# Altium footprint library JDR2812（公开）.PcbLib: 142 footprints (part 6 of 9)
Each footprint in its own frame and in the unit in brackets; x right, y up, seen from the top. Pads: shape width x height; smd on the part's side, far side on the other; paste and mask are expansions set on the pad; w line width, h text height; cw(c..) or ccw(c..) is an arc to the next point about the centre after c.
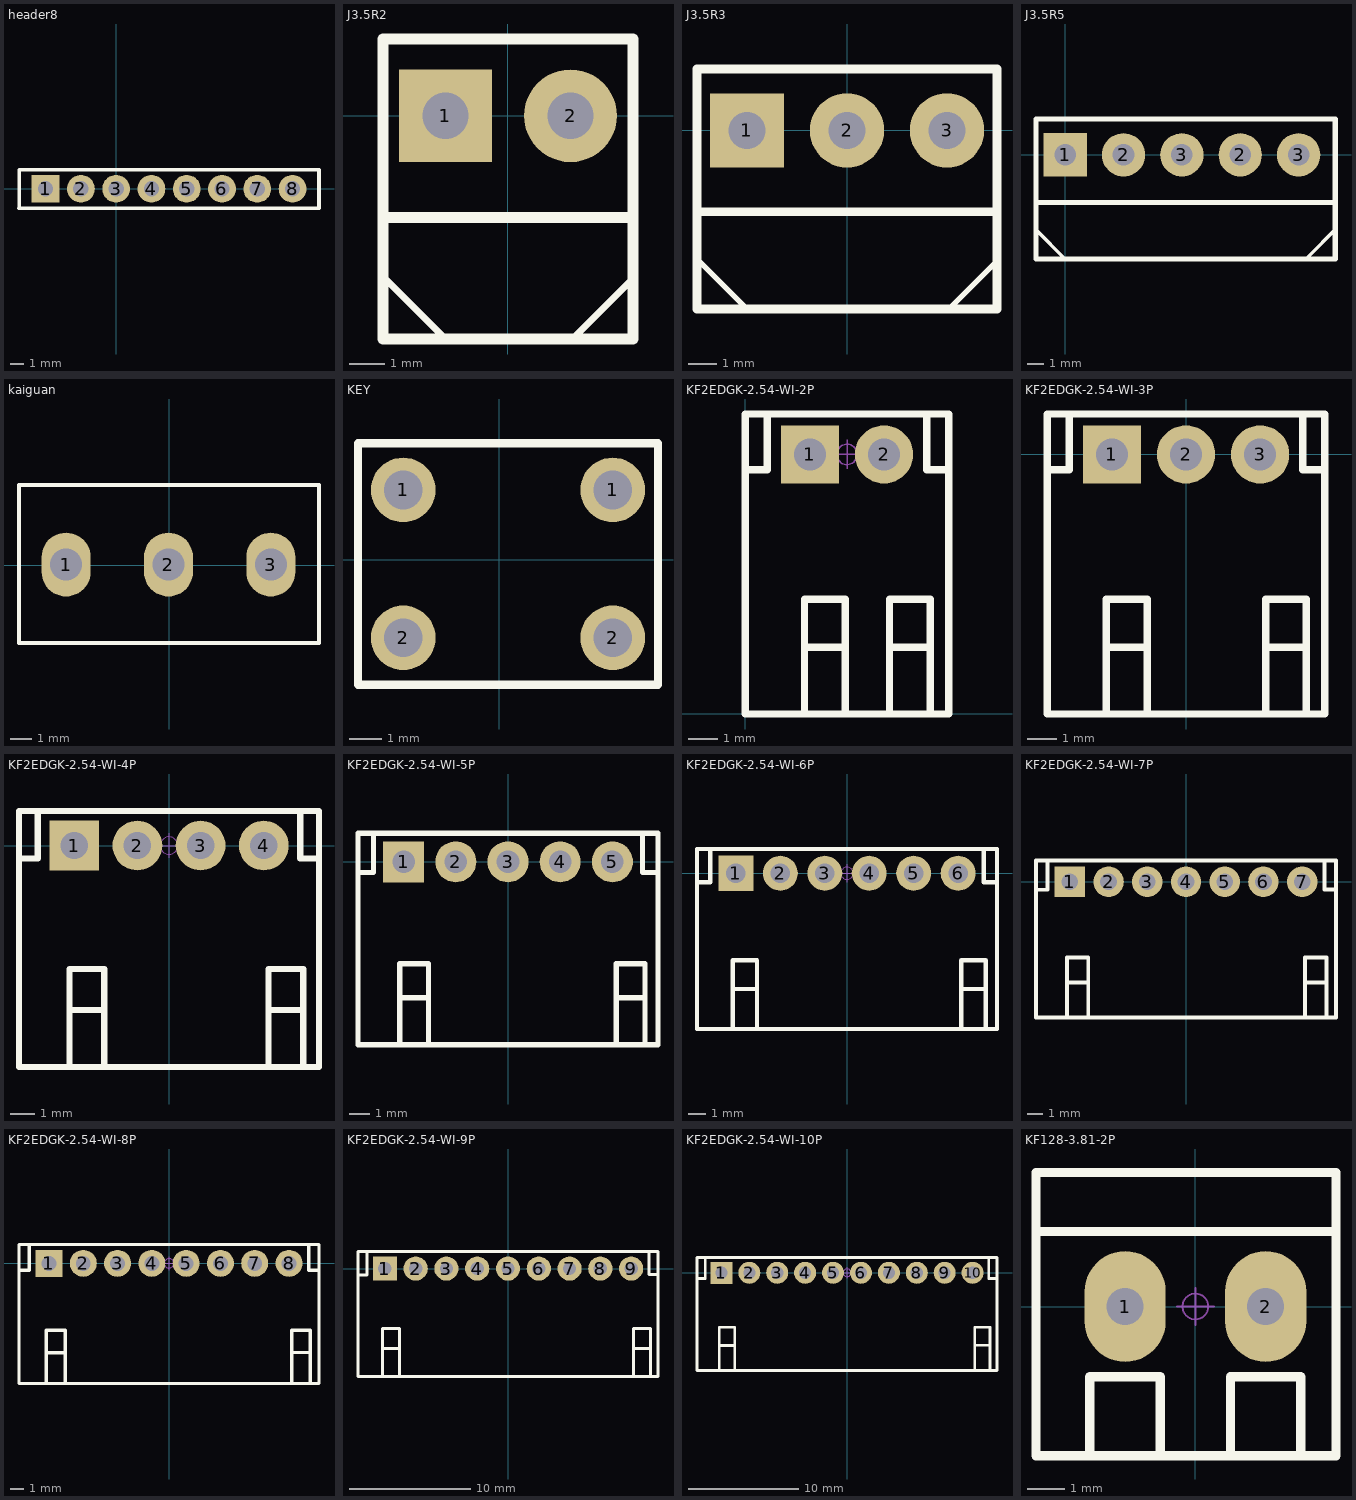
[diagram p5: the footprints below, top view; thin cyan lines are the x and y axes]

## header8 [mm] "长：14."
height 4.65
pads (8):
  rect 2x2 hole 1.1: 1(-5.08,0)
  round 2 hole 1.1: 2(-2.54,0) 3(0,0) 4(2.54,0) 5(5.08,0) 6(7.62,0) 7(10.16,0) 8(12.7,0)
Top Overlay:
  lines w0.254: 6.975,-1.407 6.985,-1.417 ; 14.595,-1.407 -3.269,-1.407 -6.995,-1.407 -6.985,-1.397 -6.985,1.387 14.605,1.387 14.605,-1.417
Mechanical 15:
  circle w0.05: c0,0 r0.35
  lines w0.05: -0.5,0 0.5,0 ; 0,-0.5 0,0.5

## J3.5R2 [mm] "3.5mm间距2芯方针，直径1.3mm，十字镙丝方向垂直针,宽7mm"
height 8.4
pads (2):
  rect 2.6x2.6 hole 1.3: 1(-1.75,0)
  round 2.6 hole 1.3: 2(1.75,0)
Top Overlay:
  lines w0.2: -3.5,-2.85 -3.5,-4.5 -1.75,-6.25 -1.496,-6.25 ; 1.806,-6.25 3.484,-4.572 3.5,-4.572
  lines w0.305: -3.5,-2.85 3.5,-2.85 ; -3.5,-6.25 3.5,-6.25 3.5,2.15 -3.5,2.15 -3.5,-6.25

## J3.5R3 [mm] "3.5mm间距3芯方针，直径1.3mm，十字镙丝方向垂直针,宽10.5mm"
height 8.4
pads (3):
  rect 2.6x2.6 hole 1.3: 1(-3.5,0)
  round 2.6 hole 1.3: 2(0,0) 3(3.5,0)
Top Overlay:
  lines w0.2: -5.25,-2.85 -5.25,-4.5 -3.5,-6.25 -3.246,-6.25 ; 3.572,-6.25 5.25,-4.572
  lines w0.305: -5.25,-2.85 5.25,-2.85 ; -5.25,-6.25 5.25,-6.25 5.25,2.15 -5.25,2.15 -5.25,-6.25

## J3.5R5 [mm] "3.5mm间距3芯方针，直径1.3mm，十字镙丝方向垂直针,宽10.5mm"
height 8.4
pads (5):
  rect 2.6x2.6 hole 1.3: 1(0,0)
  round 2.6 hole 1.3: 2(3.5,0) 2(10.5,0) 3(7,0) 3(14,0)
Top Overlay:
  lines w0.2: -1.75,-2.85 -1.75,-4.5 0,-6.25 0.254,-6.25 ; 14.565,-6.123 16.243,-4.445
  lines w0.305: -1.75,-2.85 16.129,-2.85 ; -1.75,-6.25 -1.75,2.15 16.2,2.15 16.2,-6.25 -1.75,-6.25

## kaiguan [mm]
pads (3):
  oval 2.3x3 hole 1.5: 1(-4.826,0.025) 2(-0.026,0.025) 3(4.774,0.025)
Top Overlay:
  lines w0.203: -7.036,-3.658 -7.036,3.759 7.036,3.759 7.036,-3.658 -7.036,-3.658

## KEY [mm]
pads (4):
  round 2 hole 1.2: 1(-2.967,2.162) 1(3.51,2.162) 2(-2.967,-2.41) 2(3.51,-2.41)
Top Overlay:
  lines w0.254: -4.364,-3.861 4.907,-3.861 4.907,3.602 -4.364,3.602 -4.364,-3.861

## KF2EDGK-2.54-WI-2P [mm] "长：6.93mm，宽：10.1mm，高：8.1mm"
pads (2):
  rect 2x2 hole 1.1: 1(2.22,8.898)
  round 2 hole 1.1: 2(4.76,8.898)
Top Overlay:
  lines w0.254: 0,8.38 0.757,8.38 0.757,10.285 ; 2.032,-0.002 2.032,3.935 3.429,3.935 3.429,-0.002 ; 2.032,2.284 3.429,2.284 ; 4.948,-0.002 4.948,3.935 6.345,3.935 6.345,-0.002 ; 4.948,2.284 6.345,2.284 ; 6.223,10.285 6.223,8.38 6.98,8.38 ; 0,-0.002 0,10.285 6.98,10.285 6.98,-0.002 0,-0.002
Mechanical 15:
  circle w0.05: c3.49,8.9 r0.35
  lines w0.05: 2.99,8.9 3.99,8.9 ; 3.49,8.4 3.49,9.4
3D body "KF2EDGK-2.54-WI-2P.STEP": height 8.15, standoff -3.25, extent 0,0 6.98,10.1

## KF2EDGK-2.54-WI-3P [mm] "长：9.52mm，宽：10.1mm，高：8.1mm"
pads (3):
  rect 2x2 hole 1.1: 1(-2.54,0)
  round 2 hole 1.1: 2(0,0) 3(2.54,0)
Top Overlay:
  lines w0.254: -4.76,-0.518 -4.003,-0.518 -4.003,1.387 ; -2.728,-8.9 -2.728,-4.963 -1.331,-4.963 -1.331,-8.9 ; -2.728,-6.614 -1.331,-6.614 ; 2.728,-8.9 2.728,-4.963 4.125,-4.963 4.125,-8.9 ; 2.728,-6.614 4.125,-6.614 ; 4.003,1.387 4.003,-0.518 4.76,-0.518 ; -4.76,-8.9 -4.76,1.387 4.76,1.387 4.76,-8.9 -4.76,-8.9
Mechanical 15:
  circle w0.05: c0,0 r0.35
  lines w0.05: -0.5,0 0.5,0 ; 0,-0.5 0,0.5
3D body "KF2EDGK-2.54-WI-3P.STEP": height 8.15, standoff -3.25, extent -4.76,-8.9 4.76,1.2

## KF2EDGK-2.54-WI-4P [mm] "长：12.06mm，宽：10.1mm，高：8.1mm"
pads (4):
  rect 2x2 hole 1.1: 1(-3.81,0)
  round 2 hole 1.1: 2(-1.27,0) 3(1.27,0) 4(3.81,0)
Top Overlay:
  lines w0.254: -6.03,-0.518 -5.273,-0.518 -5.273,1.387 ; -3.998,-8.9 -3.998,-4.963 -2.601,-4.963 -2.601,-8.9 ; -3.998,-6.614 -2.601,-6.614 ; 3.998,-8.9 3.998,-4.963 5.395,-4.963 5.395,-8.9 ; 3.998,-6.614 5.395,-6.614 ; 5.273,1.387 5.273,-0.518 6.03,-0.518 ; -6.03,-8.9 -6.03,1.387 6.03,1.387 6.03,-8.9 -6.03,-8.9
Mechanical 15:
  circle w0.05: c0,0 r0.35
  lines w0.05: -0.5,0 0.5,0 ; 0,-0.5 0,0.5
3D body "KF2EDGK-2.54-WI-4P.STEP": height 8.15, standoff -3.25, extent -6.03,-8.9 6.03,1.2

## KF2EDGK-2.54-WI-5P [mm] "长：14.6mm，宽：10.1mm，高：8.1mm"
pads (5):
  rect 2x2 hole 1.1: 1(-5.08,0)
  round 2 hole 1.1: 2(-2.54,0) 3(0,0) 4(2.54,0) 5(5.08,0)
Top Overlay:
  lines w0.254: -7.3,-0.518 -6.543,-0.518 -6.543,1.387 ; -5.268,-8.9 -5.268,-4.963 -3.871,-4.963 -3.871,-8.9 ; -5.268,-6.614 -3.871,-6.614 ; 5.268,-8.9 5.268,-4.963 6.665,-4.963 6.665,-8.9 ; 5.268,-6.614 6.665,-6.614 ; 6.543,1.387 6.543,-0.518 7.3,-0.518 ; -7.3,-8.9 -7.3,1.387 7.3,1.387 7.3,-8.9 -7.3,-8.9
Mechanical 15:
  circle w0.05: c0,0 r0.35
  lines w0.05: -0.5,0 0.5,0 ; 0,-0.5 0,0.5
3D body "KF2EDGK-2.54-WI-5P.STEP": height 8.15, standoff -3.25, extent -7.3,-8.9 7.3,1.2

## KF2EDGK-2.54-WI-6P [mm] "长：17.1mm，宽：10.1mm，高：8.1mm"
pads (6):
  rect 2x2 hole 1.1: 1(-6.35,0.01)
  round 2 hole 1.1: 2(-3.81,0.01) 3(-1.27,0.01) 4(1.27,0.01) 5(3.81,0.01) 6(6.35,0.01)
Top Overlay:
  lines w0.254: -8.57,-0.508 -7.813,-0.508 -7.813,1.397 ; -6.538,-8.89 -6.538,-4.953 -5.141,-4.953 -5.141,-8.89 ; -6.538,-6.604 -5.141,-6.604 ; 6.538,-8.89 6.538,-4.953 7.935,-4.953 7.935,-8.89 ; 6.538,-6.604 7.935,-6.604 ; 7.813,1.397 7.813,-0.508 8.57,-0.508 ; -8.57,-8.89 -8.57,1.397 8.57,1.397 8.57,-8.89 -8.57,-8.89
Mechanical 15:
  circle w0.05: c0,0.01 r0.35
  lines w0.05: -0.5,0.01 0.5,0.01 ; 0,-0.49 0,0.51
3D body "KF2EDGK-2.54-WI-6P.STEP": height 8.15, standoff -3.25, extent -8.57,-8.89 8.57,1.21

## KF2EDGK-2.54-WI-7P [mm] "长：22.22mm，宽：10.1mm，高：8.1mm"
pads (7):
  rect 2x2 hole 1.1: 1(-7.62,0)
  round 2 hole 1.1: 2(-5.08,0) 3(-2.54,0) 4(0,0) 5(2.54,0) 6(5.08,0) 7(7.62,0)
Top Overlay:
  lines w0.254: -9.84,-0.518 -9.083,-0.518 -9.083,1.387 ; -9.84,1.387 -9.84,-8.9 9.84,-8.9 ; -9.84,1.397 9.84,1.397 9.84,-8.89 ; -7.808,-8.9 -7.808,-4.963 -6.411,-4.963 -6.411,-8.9 ; -7.808,-6.614 -6.411,-6.614 ; 7.808,-8.89 7.808,-4.953 9.205,-4.953 9.205,-8.89 ; 7.808,-6.604 9.205,-6.604 ; 9.083,1.397 9.083,-0.508 9.84,-0.508
Mechanical 15:
  circle w0.05: c0,0 r0.35
  lines w0.05: -0.5,0 0.5,0 ; 0,-0.5 0,0.5
3D body "KF2EDGK-2.54-WI-7P.STEP": height 8.15, standoff -3.25, extent -9.84,-8.9 9.84,1.2

## KF2EDGK-2.54-WI-8P [mm] "长：22.22mm，宽：10.1mm，高：8.1mm"
pads (8):
  rect 2x2 hole 1.1: 1(-8.89,0)
  round 2 hole 1.1: 2(-6.35,0) 3(-3.81,0) 4(-1.27,0) 5(1.27,0) 6(3.81,0) 7(6.35,0) 8(8.89,0)
Top Overlay:
  lines w0.254: -11.11,-0.518 -10.353,-0.518 -10.353,1.387 ; -11.11,1.387 -11.11,-8.9 11.11,-8.9 ; -11.11,1.397 11.11,1.397 11.11,-8.89 ; -9.078,-8.9 -9.078,-4.963 -7.681,-4.963 -7.681,-8.9 ; -9.078,-6.614 -7.681,-6.614 ; 9.078,-8.89 9.078,-4.953 10.475,-4.953 10.475,-8.89 ; 9.078,-6.604 10.475,-6.604 ; 10.353,1.397 10.353,-0.508 11.11,-0.508
Mechanical 15:
  circle w0.05: c0,0 r0.35
  lines w0.05: -0.5,0 0.5,0 ; 0,-0.5 0,0.5
3D body "KF2EDGK-2.54-WI-8P.STEP": height 8.15, standoff -3.25, extent -11.11,-8.9 11.11,1.2

## KF2EDGK-2.54-WI-9P [mm] "长：27.76mm，宽：10.1mm，高：8.1mm"
pads (9):
  rect 2x2 hole 1.1: 1(-10.16,0)
  round 2 hole 1.1: 2(-7.62,0) 3(-5.08,0) 4(-2.54,0) 5(0,0) 6(2.54,0) 7(5.08,0) 8(7.62,0) 9(10.16,0)
Top Overlay:
  lines w0.254: -12.38,-0.518 -11.623,-0.518 -11.623,1.387 ; -12.38,1.387 -12.38,-8.9 12.38,-8.9 ; -12.38,1.397 12.38,1.397 12.38,-8.89 ; -10.348,-8.9 -10.348,-4.963 -8.951,-4.963 -8.951,-8.9 ; -10.348,-6.614 -8.951,-6.614 ; 10.348,-8.89 10.348,-4.953 11.745,-4.953 11.745,-8.89 ; 10.348,-6.604 11.745,-6.604 ; 11.623,1.397 11.623,-0.508 12.38,-0.508
Mechanical 15:
  circle w0.05: c0,0 r0.35
  lines w0.05: -0.5,0 0.5,0 ; 0,-0.5 0,0.5
3D body "KF2EDGK-2.54-WI-9P.STEP": height 8.15, standoff -3.25, extent -12.38,-8.9 12.38,1.2

## KF2EDGK-2.54-WI-10P [mm] "长：27.3mm，宽：10.1mm，高：8.1mm"
pads (10):
  rect 2x2 hole 1.1: 1(-11.43,0)
  round 2 hole 1.1: 2(-8.89,0) 3(-6.35,0) 4(-3.81,0) 5(-1.27,0) 6(1.27,0) 7(3.81,0) 8(6.35,0) 9(8.89,0) 10(11.43,0)
Top Overlay:
  lines w0.254: -13.65,-0.518 -12.893,-0.518 -12.893,1.387 ; -13.65,1.387 -13.65,-8.9 13.65,-8.9 ; -13.65,1.397 13.65,1.397 13.65,-8.89 ; -11.618,-8.9 -11.618,-4.963 -10.221,-4.963 -10.221,-8.9 ; -11.618,-6.614 -10.221,-6.614 ; 11.618,-8.89 11.618,-4.953 13.015,-4.953 13.015,-8.89 ; 11.618,-6.604 13.015,-6.604 ; 12.893,1.397 12.893,-0.508 13.65,-0.508
Mechanical 15:
  circle w0.05: c0,0 r0.35
  lines w0.05: -0.5,0 0.5,0 ; 0,-0.5 0,0.5
3D body "KF2EDGK-2.54-WI-10P.STEP": height 8.15, standoff -3.25, extent -13.65,-8.9 13.65,1.2

## KF128-3.81-2P [mm] "螺钉式接线端子，脚距3.81mm"
pads (2):
  oval 2.2x3 hole 1: 1(-1.905,0) 2(1.905,0)
Top Overlay:
  lines w0.254: -4.318,2.032 3.81,2.032 ; -2.857,-4.039 -2.857,-1.905 -0.953,-1.905 -0.953,-4.039 ; 0.953,-4.039 0.953,-1.905 2.857,-1.905 2.857,-4.039 ; -4.318,-4.039 -4.318,3.632 3.81,3.632 3.81,-4.039 -4.318,-4.039
Mechanical 15:
  circle w0.05: c0,0 r0.35
  lines w0.05: -0.5,0 0.5,0 ; 0,-0.5 0,0.5
3D body "KF128.STEP": height 8.55, standoff -3.95, extent -0.5,-3.9 3.81,3.5
3D body "KF128.STEP": height 8.55, standoff -3.95, extent -4.31,-3.9 0,3.5